# Altium footprint library GZ7_1_x.PcbLib: 61 footprints (part 4 of 4)
Each footprint in its own frame and in the unit in brackets; x right, y up, seen from the top. Pads: shape width x height; smd on the part's side, far side on the other; paste and mask are expansions set on the pad; w line width, h text height; cw(c..) or ccw(c..) is an arc to the next point about the centre after c.
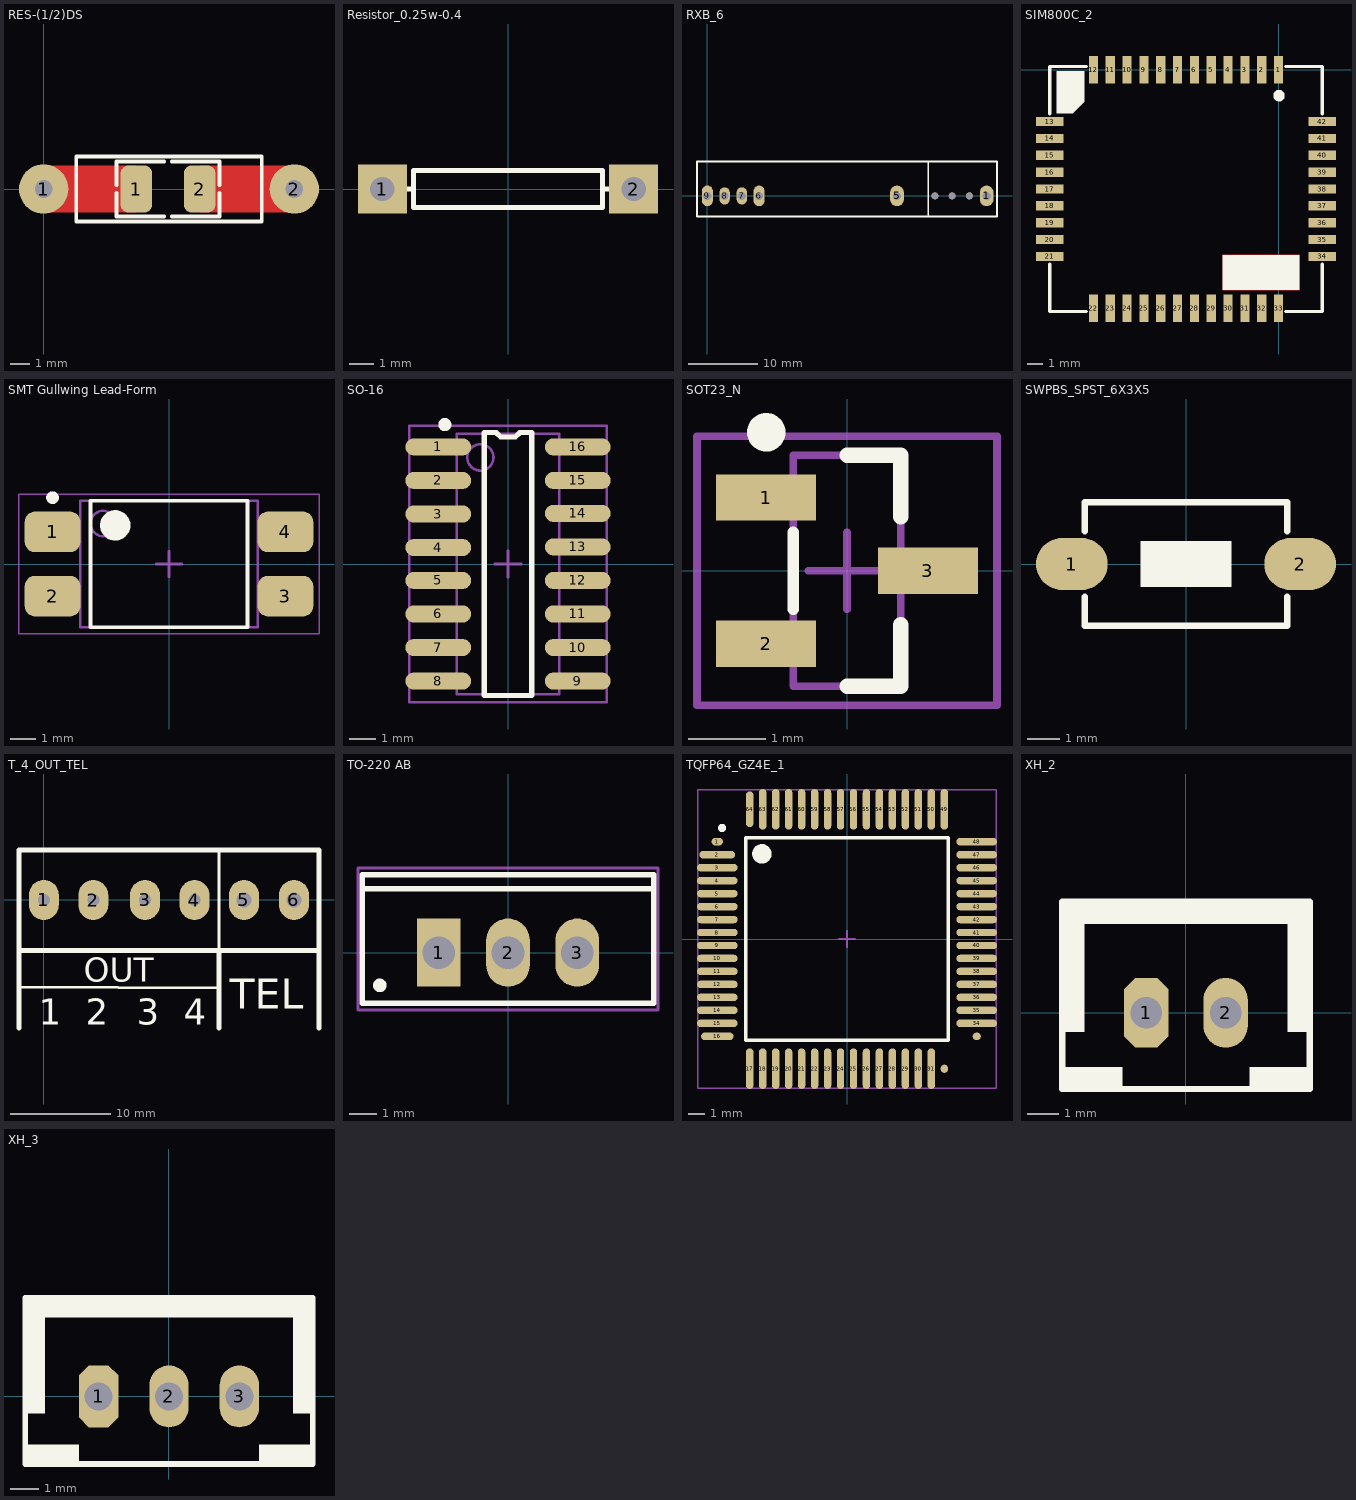
[diagram p3: the footprints below, top view; thin cyan lines are the x and y axes]

## RES-(1/2)DS [mm]
pads (4):
  round 2.5 hole 0.9 paste-2539.97 mask+0.075: 1(0,0) 2(12.7,0)
  rrect50% 1.6x2.4 smd paste-0.2 mask+0.075: 1(4.7,0) 2(7.9,0)
Top Layer:
  rectangle: 7.9,-1.2 12.7,1.2
  region: 4.7,1.2 -0.1,1.2 -0.1,-1.2 4.7,-1.2
Top Overlay:
  lines w0.2: 3.7,-0.2 3.7,-1.4 6.1,-1.4 ; 3.7,0.2 3.7,1.4 6.1,1.4 ; 6.5,-1.4 8.9,-1.4 8.9,-0.2 ; 6.5,1.4 8.9,1.4 8.9,0.2 ; 1.651,-1.651 11.049,-1.651 11.049,1.651 1.651,1.651 1.651,-1.651
3D body "RES 1210 (3225 metric).STEP": height 0.69, standoff -0.01, extent 4.6,-1.35 8,1.35

## Resistor_0.25w-0.4 [mm]
height 1.524
pads (2):
  rect 2x2 hole 1 mask+0.08: 1(-5.152,0) 2(5.152,0)
Top Overlay:
  lines w0.2: -4.111,0 -3.882,0 ; 4.111,0 3.882,0 ; 3.882,0 3.882,0.762 -3.882,0.762 -3.882,-0.762 3.883,-0.762 3.882,0
3D body "Resistor_0.25W.STEP": height 3.43, standoff -2.04, extent -5.457,-1.156 5.312,1.156

## RXB_6 [mm]
pads (9):
  oval 2x3 hole 1.2: 1(40.5,0) 5(27.5,0)
  round 1 hole 1: 2(38,0) 3(35.5,0) 4(33,0)
  oval 1.6x3 hole 1.2 mask+0.1: 6(7.5,0) 9(0,0)
  oval 1.5x2.5 hole 1.2 mask+0.1: 7(5,0) 8(2.5,0)
Top Overlay:
  lines w0.2: 32,-3 32,5
  lines w0.25: 32,5 42,5 ; 42,5 -1.5,5 -1.5,-3 42,-3 42,5

## SIM800C_2 [mm]
pads (42):
  rect 0.6x1.8 smd: 1(0,0) 2(-1.1,0) 3(-2.2,0) 4(-3.3,0) 5(-4.4,0) 6(-5.5,0) 7(-6.6,0) 8(-7.7,0) 9(-8.8,0) 10(-9.9,0) 11(-11,0) 12(-12.1,0) 22(-12.1,-15.6) 23(-11,-15.6) 24(-9.9,-15.6) 25(-8.8,-15.6) 26(-7.7,-15.6) 27(-6.6,-15.6) 28(-5.5,-15.6) 29(-4.4,-15.6) 30(-3.3,-15.6) 31(-2.2,-15.6) 32(-1.1,-15.6) 33(0,-15.6)
  rect 1.8x0.6 smd: 13(-14.95,-3.4) 14(-14.95,-4.5) 15(-14.95,-5.6) 16(-14.95,-6.7) 17(-14.95,-7.8) 18(-14.95,-8.9) 19(-14.95,-10) 20(-14.95,-11.1) 21(-14.95,-12.2) 34(2.85,-12.2) 35(2.85,-11.1) 36(2.85,-10) 37(2.85,-8.9) 38(2.85,-7.8) 39(2.85,-6.7) 40(2.85,-5.6) 41(2.85,-4.5) 42(2.85,-3.4)
Top Layer:
  pour cut-out: 1.35,-14.4 1.35,-12.1 -3.65,-12.1 -3.65,-14.4
Top Overlay:
  circle w0.35: c0.025,-1.7 r0.2
  region: -3.65,-12.1 -3.65,-14.4 1.35,-14.4 1.35,-12.1
  region: -14.5,-2.85 -14.5,-0.1 -12.7,-0.1 -12.7,-2.1 -13.45,-2.85
  lines w0.2: -14.95,-12.7 -14.95,-15.8 -12.55,-15.8 ; -14.95,-2.9 -14.95,0.2 -12.55,0.2 ; 0.45,-15.8 2.85,-15.8 2.85,-12.7 ; 0.45,0.2 2.85,0.2 2.85,-2.9
3D body "SIM800C-1.STEP": height 2.37, standoff 0.03, extent -14.6,-15.7 3,0

## SMT Gullwing Lead-Form [mm] "SOP, 4-Leads, Body 4/65x6/75mm, Pitch 2/54mm, IPC Medium Density designer:abbas basereh"
height 3.5
pads (4):
  rrect50% 2.2x1.6 smd mask+0.06: 1(-4.6,1.27) 2(-4.6,-1.27) 3(4.6,-1.27) 4(4.6,1.27)
Top Overlay:
  circle w0.6: c-2.125,1.525 r0.3
  circle w0.25: c-4.6,2.62 r0.125
  lines w0.15: -3.1,-2.5 3.1,-2.5 3.1,2.5 -3.1,2.5 -3.1,-2.5
Mechanical 13:
  circle w0.1: c-2.6,1.6 r0.5
  lines w0.1: -3.5,-2.5 3.5,-2.5 3.5,2.5 -3.5,2.5 -3.5,-2.5
Mechanical 15:
  lines w0.05: -5.925,-2.75 5.925,-2.75 5.925,2.75 -5.925,2.75 -5.925,-2.75
  lines w0.1: -0.5,0 0.5,0 ; 0,-0.5 0,0.5
3D body "User Library-PC817_Gullwing.STEP": height 3.89, standoff 0.04, extent -5,-2.29 5,2.29

## SO-16 [mm] "16-Pin Small Outline Integrated Circuit 1.27 mm Pitch, IPC Medium Density - DESIGNER ABBAS BASEREH"
height 1.75
pads (16):
  oval 2.5x0.65 smd: 1(-2.65,4.45) 2(-2.65,3.175) 3(-2.65,1.9) 4(-2.65,0.625) 5(-2.65,-0.625) 6(-2.65,-1.9) 7(-2.65,-3.175) 8(-2.65,-4.45) 9(2.65,-4.45) 10(2.65,-3.175) 11(2.65,-1.9) 12(2.65,-0.625) 13(2.65,0.65) 14(2.65,1.925) 15(2.65,3.175) 16(2.65,4.45)
Top Overlay:
  circle w0.25: c-2.4,5.295 r0.125
  lines w0.2: -0.9,-5 0.9,-5 0.9,5 0.45,5 0.276,4.826 -0.276,4.826 -0.45,5 -0.9,5 -0.9,-5
Mechanical 13:
  circle w0.1: c-1.05,4.05 r0.5
  lines w0.1: -1.95,-4.95 1.95,-4.95 1.95,4.95 -1.95,4.95 -1.95,-4.95
Mechanical 15:
  lines w0.1: -0.5,0 0.5,0 ; 0,-0.5 0,0.5 ; -3.75,-5.25 3.75,-5.25 3.75,5.25 -3.75,5.25 -3.75,-5.25
3D body "so16.x_t": height 1.7, standoff 0, extent -3,-5.1 3,5.1

## SOT23_N [mm] "SOT23, 3-Leads, Body 2.9x1.3mm, Pitch 0.95mm, Lead Span 2.3mm, IPC Medium Density"
height 1.1
pads (3):
  rect 1.3x0.6 smd: 1(-1.05,0.95) 2(-1.05,-0.95) 3(1.05,0)
Top Overlay:
  circle w0.25: c-1.05,1.8 r0.125
  lines w0.15: -0.7,-0.5 -0.7,0.5
  lines w0.2: 0,-1.5 0.7,-1.5 0.7,-0.7 ; 0,1.5 0.7,1.5 0.7,0.7
Mechanical 13:
  lines w0.1: -0.7,-1.5 0.7,-1.5 0.7,1.5 -0.7,1.5 -0.7,-1.5
Mechanical 15:
  lines w0.1: -0.5,0 0.5,0 ; 0,-0.5 0,0.5 ; -1.95,-1.75 1.95,-1.75 1.95,1.75 -1.95,1.75 -1.95,-1.75
3D body "User Library-SOT-23-3-1.STEP": height 1.1, standoff 0, extent -1.271,-1.5 1.271,1.5

## SWPBS_SPST_6X3X5 [mm] "SWITCH, PUSHBUTTON, SMD, SPST, 6X3.5mm, SKQMBBE010, 50000 Cycles, 1.57N Force"
height 5
pads (2):
  oval 2.2x1.6 smd mask+0.1: 1(-3.5,0) 2(3.5,0)
Top Overlay:
  region: 1.4,0.7 -1.4,0.7 -1.4,-0.7 1.4,-0.7
  lines w0.2: -3.1,-1 -3.1,-1.9 3.1,-1.9 3.1,-1 ; -3.1,1 -3.1,1.9 3.1,1.9 3.1,1
3D body "43685.stp": height 5, standoff 0, extent -3.649,-1.75 3.65,1.75

## T_4_OUT_TEL [mm]
pads (6):
  oval 3x4 hole 1.2: 1(0,0) 2(4.938,-0.012) 3(10.112,0) 4(15.05,-0.012)
  oval 3x4 hole 1.5: 5(20,0) 6(25,0)
Top Overlay:
  lines w0.2: -2.484,2.286 -2.484,5
  lines w0.254: -2.484,-12.118 -2.484,5 ; -1.276,5 -2.484,5 ; 7.4,-5.054 -2.484,-5.054 ; 7.716,-5.054 -2.484,-5.054 ; -2.484,-5.054 -2.484,-12.818 -2.484,5 ; -2.484,-5.054 -2.484,5
  lines w0.3: -2.484,5 17.5,5 ; -2.4,-8.7 17.3,-8.8 ; 7.5,-5.054 17.5,-5.054 17.5,5 ; 17.5,-12.8 17.5,0 ; 27.5,-12.8 27.5,5 17.5,5
  lines w0.4: 17.5,-5 27.5,-5 ; 27.5,-12.8 27.5,5
  lines w0.5: -2.484,-12.818 -2.484,5 27.5,5 27.5,-12.8 ; -2.484,-5.054 27.5,-5.054 ; 17.5,-12.8 17.5,-5.054
  text "OUT" at 4,-8.2 h2.4
  text "1" at -0.5,-12.5 h2.6
  text "3" at 9.3,-12.5 h2.6
  text "2" at 4.2,-12.5 h2.6
  text "4" at 14,-12.5 h2.6
  text "TEL" at 18.6,-10.9 h3
3D body "KF128-2P.STEP": height 14.15, standoff -3.8, extent 7.012,-5.3 17.612,5
3D body "KF128-2P.STEP": height 14.15, standoff -3.8, extent -3.1,-5.3 7.5,5
3D body "KF128-2P.STEP": height 14.15, standoff -3.8, extent 16.9,-5.3 27.5,5

## TO-220 AB [mm] "Epoxy meets UL94, V0-Design:Abbas Basereh"
height 17
pads (3):
  rect 1.6x2.5 hole 1.2: 1(-2.54,0)
  oval 1.6x2.5 hole 1.2: 2(0,0) 3(2.54,0)
Top Overlay:
  circle w0.25: c-4.7,-1.2 r0.125
  lines w0.2: -5.35,2.35 5.35,2.35 ; -5.35,-1.85 5.35,-1.85 5.35,2.85 -5.35,2.85 -5.35,-1.85
Mechanical 13:
  lines w0.1: -5.35,-1.85 -5.35,2.85 5.35,2.85 5.35,-1.85 -5.35,-1.85
Mechanical 15:
  lines w0.1: -0.5,0 0.5,0 ; 0,-0.5 0,0.5 ; -5.5,-2.1 -5.5,3.1 5.5,3.1 5.5,-2.1 -5.5,-2.1
3D body "SW3DPS-TO-220HS-DEFAULT.STEP": height 18.54, standoff -3.81, extent -5.08,-1.651 5.08,2.921

## TQFP64_GZ4E_1 [mm]
pads (64):
  oval 0.7x0.46 smd: 1(-8,6)
  oval 2.2x0.46 smd: 2(-8,5.2)
  oval 2.5x0.46 smd: 3(-8,4.4) 4(-8,3.6) 5(-8,2.8) 6(-8,2) 7(-8,1.2) 8(-8,0.4) 9(-8,-0.4) 10(-8,-1.2) 11(-8,-2) 12(-8,-2.8) 13(-8,-3.6) 14(-8,-4.4) 15(-8,-5.2) 34(8,-5.2) 35(8,-4.4) 36(8,-3.6) 37(8,-2.8) 38(8,-2) 39(8,-1.2) 40(8,-0.4) 41(8,0.4) 42(8,1.2) 43(8,2) 44(8,2.8) 45(8,3.6) 46(8,4.4) 47(8,5.2) 48(8,6)
  oval 2x0.46 smd: 16(-8,-6)
  oval 0.46x2.5 smd: 17(-6,-8) 18(-5.2,-8) 19(-4.4,-8) 20(-3.6,-8) 21(-2.8,-8) 22(-2,-8) 23(-1.2,-8) 24(-0.4,-8) 25(0.4,-8) 26(1.2,-8) 27(2,-8) 28(2.8,-8) 29(3.6,-8) 30(4.4,-8) 31(5.2,-8) 49(6,8) 50(5.2,8) 51(4.4,8) 52(3.6,8) 53(2.8,8) 54(2,8) 55(1.2,8) 56(0.4,8) 57(-0.4,8) 58(-1.2,8) 59(-2,8) 60(-2.8,8) 61(-3.6,8) 62(-4.4,8) 63(-5.2,8)
  oval 0.46x0.5 smd: 32(6,-8)
  oval 0.5x0.46 smd: 33(8,-6)
  oval 0.46x2.2 smd: 64(-6,8)
Top Overlay:
  circle w0.25: c-7.7,6.85 r0.125
  circle w0.6: c-5.25,5.25 r0.3
  lines w0.2: -6.25,-6.25 -6.25,6.25 6.25,6.25 6.25,-6.25 -6.25,-6.25
Mechanical 15:
  lines w0.1: -0.5,0 0.5,0 ; 0,-0.5 0,0.5 ; -9.2,-9.2 -9.2,9.2 9.2,9.2 9.2,-9.2 -9.2,-9.2
3D body "User Library-TQFP 64 14x14mm 0_8mm pitch.step": height 1.5, standoff 0, extent -8.01,-8 7.99,8

## XH_2 [mm] "PW10-x-M, JST-BxB-XH-A pitch: 2.5mm, 3A/250v"
pads (2):
  oct 1.4x2.2 hole 1: 1(-1.25,0)
  oval 1.4x2.2 hole 1: 2(1.25,0)
Top Overlay:
  rectangle: -3.9,-2.4 -2,-1.7
  rectangle: -3.9,-0.6 -3.2,3.5
  region: -3.9,3.5 -3.9,2.8 3.9,2.8 3.9,3.5
  region: 3.9,3.5 3.2,3.5 3.2,-0.6 3.9,-0.6
  region: 3.9,-1.7 2,-1.7 2,-2.4 3.9,-2.4
  lines w0.2: -3.9,-2.4 3.9,-2.4 3.9,3.5 -3.9,3.5 -3.9,-2.4
3D body "User Library-PW10-02-M white.step": height 7, standoff -3.3, extent -3.75,-2.3 3.75,3.4

## XH_3 [mm] "PW10-x-M, JST-BxB-XH-A pitch: 2.5mm, 3A/250v"
height 1.524
pads (3):
  oct 1.4x2.2 hole 1 mask+0.08: 1(-2.5,0)
  oval 1.4x2.2 hole 1 mask+0.08: 2(0,0) 3(2.5,0)
Top Overlay:
  region: 5.1,-1.7 3.2,-1.7 3.2,-2.4 5.1,-2.4
  region: 5.1,3.5 4.4,3.5 4.4,-0.6 5.1,-0.6
  region: -5.1,3.5 -5.1,2.8 5.1,2.8 5.1,3.5
  rectangle: -5.1,-0.6 -4.4,3.5
  rectangle: -5.1,-2.4 -3.2,-1.7
  lines w0.2: -5.1,-2.4 -5.1,3.5 5.1,3.5 5.1,-2.4 -5.1,-2.4
3D body "User Library-PW10-03-M white.step": height 7, standoff -3.3, extent -5,-2.3 5,3.4